# Altium footprint library Blue Pill Module.PcbLib: 1 footprints
Each footprint in its own frame and in the unit in brackets; x right, y up, seen from the top. Pads: shape width x height; smd on the part's side, far side on the other; paste and mask are expansions set on the pad; w line width, h text height; cw(c..) or ccw(c..) is an arc to the next point about the centre after c.
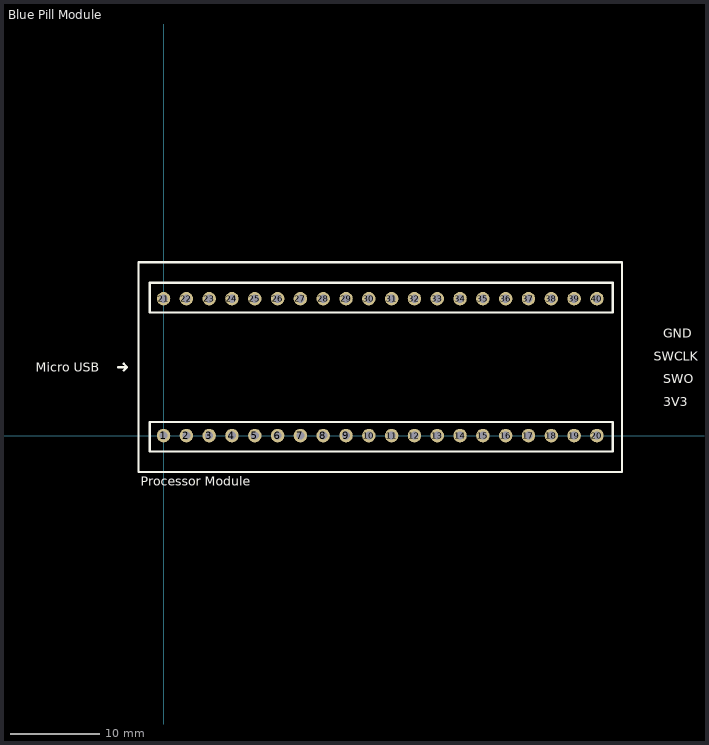
[diagram p0: the footprint, top view; thin cyan lines are the x and y axes]

## Blue Pill Module [mm] "STM32F103C8T6 Module"
pads (40):
  round 1.5 hole 0.9: 1(0,0) 2(2.54,0) 3(5.08,0) 4(7.62,0) 5(10.16,0) 6(12.7,0) 7(15.24,0) 8(17.78,0) 9(20.32,0) 10(22.86,0) 11(25.4,0) 12(27.94,0) 13(30.48,0) 14(33.02,0) 15(35.56,0) 16(38.1,0) 17(40.64,0) 18(43.18,0) 19(45.72,0) 20(48.26,0) 21(0,15.24) 22(2.54,15.24) 23(5.08,15.24) 24(7.62,15.24) 25(10.16,15.24) 26(12.7,15.24) 27(15.24,15.24) 28(17.78,15.24) 29(20.32,15.24) 30(22.86,15.24) 31(25.4,15.24) 32(27.94,15.24) 33(30.48,15.24) 34(33.02,15.24) 35(35.56,15.24) 36(38.1,15.24) 37(40.64,15.24) 38(43.18,15.24) 39(45.72,15.24) 40(48.26,15.24)
Top Overlay:
  lines w0.254: -5.08,7.62 -4.064,7.62 ; -4.445,7.239 -4.064,7.62 ; -4.445,8.001 -4.064,7.62 ; -2.794,-4.064 51.054,-4.064 51.054,19.304 -2.794,19.304 -2.794,-4.064 ; -1.524,-1.778 -1.524,1.524 50.038,1.524 50.038,-1.778 -1.524,-1.778 ; -1.524,13.716 -1.524,17.018 50.038,17.018 50.038,13.716 -1.524,13.716
  text "Micro USB" at -14.224,7.112 h1.02
  text "Processor Module" at -2.54,-5.588 h1.02
  text "GND" at 55.626,10.897 h1.02
  text "3V3" at 55.626,3.277 h1.02
  text "SWO" at 55.626,5.817 h1.02
  text "SWCLK" at 54.61,8.357 h1.02
3D body "hdr-1x01-m-90lo-tht-2.54mm.step": height 15.04, standoff 8.65, extent 44.053,2.515 54.153,5.055
3D body "hdr-1x01-m-90lo-tht-2.54mm.step": height 15.04, standoff 8.65, extent 44.053,5.055 54.153,7.595
3D body "hdr-1x01-m-90lo-tht-2.54mm.step": height 15.04, standoff 8.65, extent 44.053,7.595 54.153,10.135
3D body "hdr-1x01-m-90lo-tht-2.54mm.step": height 15.04, standoff 8.65, extent 44.048,10.135 54.148,12.675
3D body "zl201-20_p2-54_l50-8_w2-54_h8-9.stp": height 14.25, standoff 2.31, extent -1.27,-1.27 49.53,1.27
3D body "YAAJ_BluePill.step": height 22.1, standoff 9.6, extent -2.37,-3.68 50.63,18.92
3D body "zl201-20_p2-54_l50-8_w2-54_h8-9.stp": height 14.25, standoff 2.31, extent -1.27,14.097 49.53,16.637
3D body "Header Female 1x10.STEP": height 8.59, standoff -3.29, extent -2.032,-1.27 23.968,1.205
3D body "Header Female 1x10.STEP": height 8.59, standoff -3.29, extent 23.444,-1.256 49.444,1.219
3D body "Header Female 1x10.STEP": height 8.59, standoff -3.29, extent -1.067,14.01 24.933,16.485
3D body "Header Female 1x10.STEP": height 8.59, standoff -3.29, extent 24.13,14.003 50.13,16.477